# Altium footprint library GRID.PcbLib: 54 footprints (part 2 of 4)
Each footprint in its own frame and in the unit in brackets; x right, y up, seen from the top. Pads: shape width x height; smd on the part's side, far side on the other; paste and mask are expansions set on the pad; w line width, h text height; cw(c..) or ccw(c..) is an arc to the next point about the centre after c.
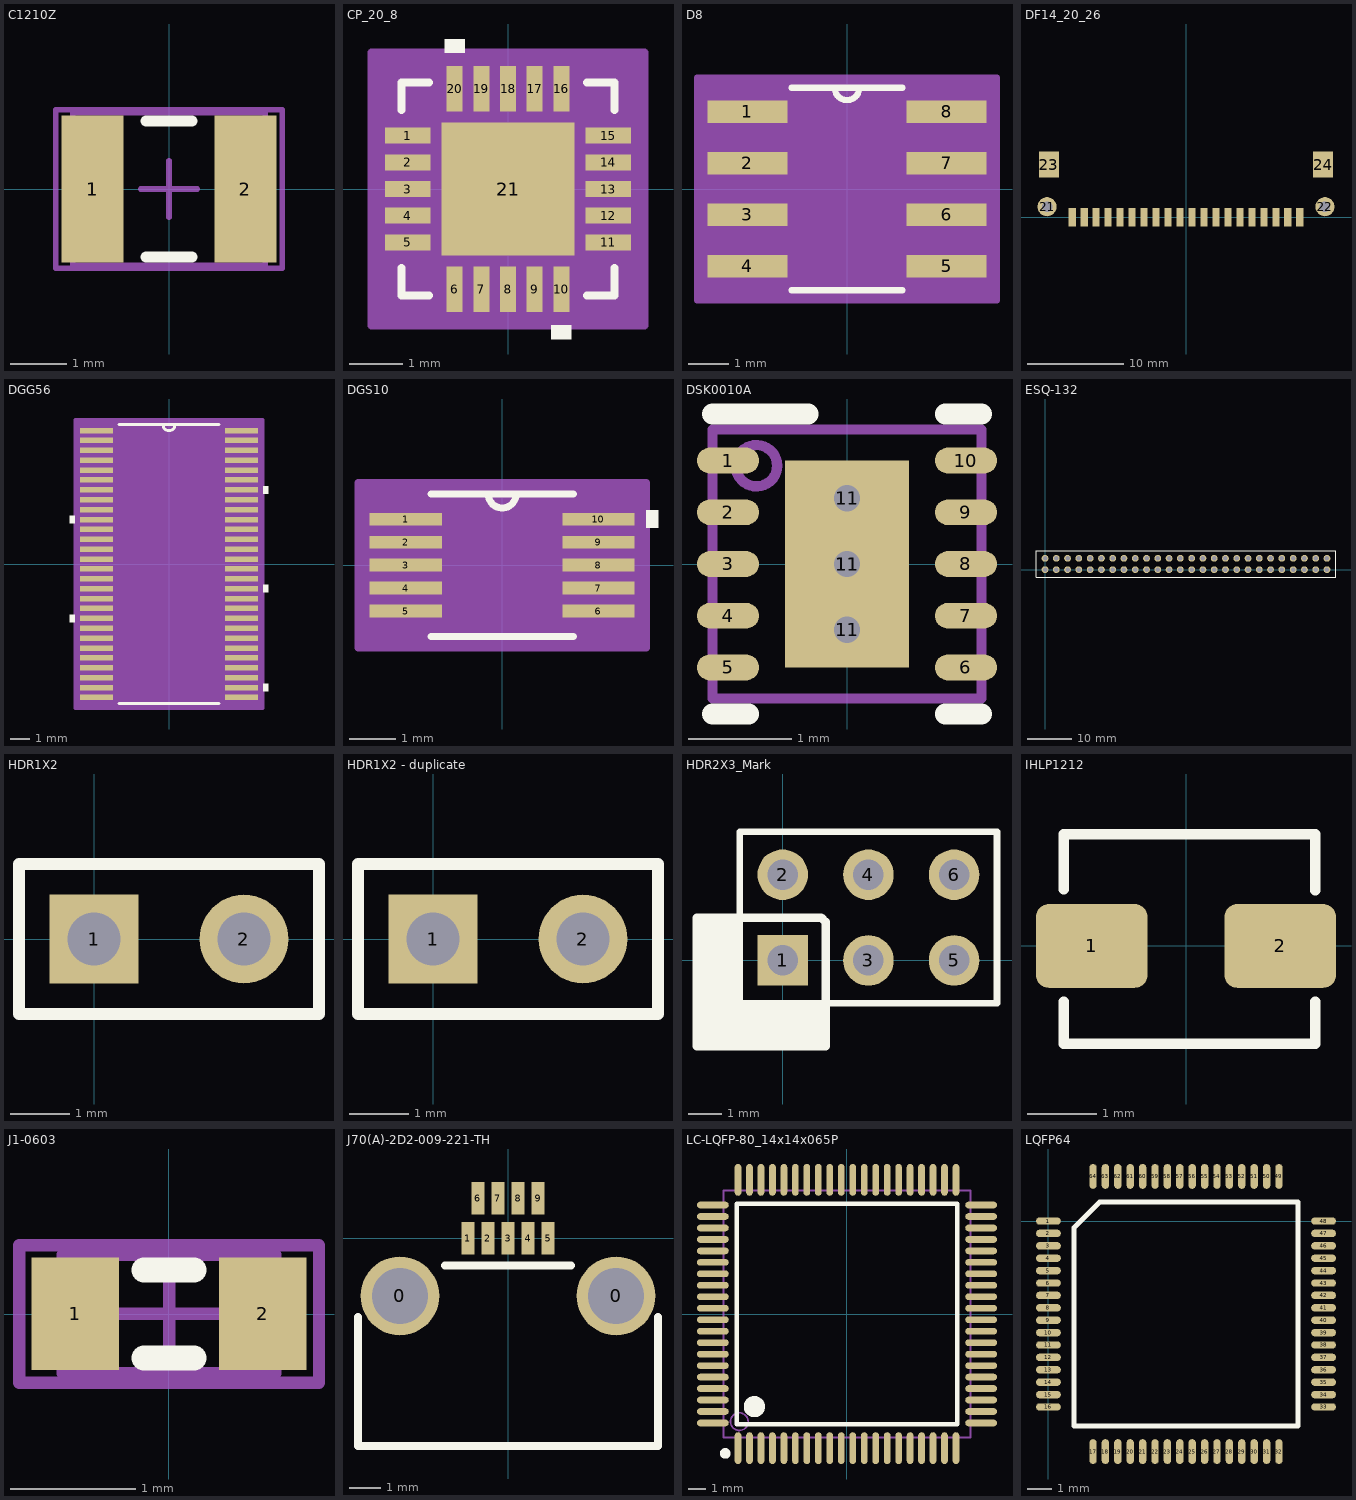
[diagram p1: the footprints below, top view; thin cyan lines are the x and y axes]

## C1210Z [mm] "Chip Capacitor, Body 3.2x2.5mm, IPC High Density"
height 1.3
pads (2):
  rect 1.1x2.6 smd: 1(-1.35,0) 2(1.35,0)
Top Overlay:
  lines w0.2: -0.4,-1.2 0.4,-1.2 ; -0.4,1.2 0.4,1.2
Mechanical 13:
  lines w0.1: -1.7,-1.35 -1.7,1.35 1.7,1.35 1.7,-1.35 -1.7,-1.35
Mechanical 15:
  lines w0.1: -0.5,0 0.5,0 ; 0,-0.5 0,0.5 ; -2,-1.4 -2,1.4 2,1.4 2,-1.4 -2,-1.4
3D body: height 1.3, standoff 0, extent -1.7,-1.35 1.7,1.35

## CP_20_8 [mm]
pads (21):
  rect 0.855x0.3 smd: 1(-1.877,1) 2(-1.877,0.5) 3(-1.877,0) 4(-1.877,-0.5) 5(-1.877,-1) 11(1.877,-1) 12(1.877,-0.5) 13(1.877,0) 14(1.877,0.5) 15(1.877,1)
  rect 0.3x0.855 smd: 6(-1,-1.877) 7(-0.5,-1.877) 8(0,-1.877) 9(0.5,-1.877) 10(1,-1.877) 16(1,1.877) 17(0.5,1.877) 18(0,1.877) 19(-0.5,1.877) 20(-1,1.877)
  rect 2.5x2.5 smd paste-1.287: 21(0,0)
Top Overlay:
  region: -0.81,2.559 -1.191,2.559 -1.191,2.813 -0.81,2.813
  region: 1.191,-2.559 0.81,-2.559 0.81,-2.813 1.191,-2.813
  lines w0.152: -2,-1.483 -2,-2 -1.483,-2 ; -2,1.483 -2,2 -1.483,2 ; 1.483,-2 2,-2 2,-1.483 ; 1.483,2 2,2 2,1.483
Mechanical 13:
  lines w0.025: -2,0.73 -0.73,2 ; -2,-2 -2,2 2,2 2,-2 -2,-2 ; -2,-1.15 -2,-0.85 -2,-1.15 ; -2,-0.65 -2,-0.35 -2,-0.65 ; -2,-0.15 -2,0.15 -2,-0.15 ; -2,0.35 -2,0.65 -2,0.35 ; -2,0.85 -2,1.15 -2,0.85 ; -1.15,-2 -0.85,-2 -1.15,-2 ; -1.15,2 -0.85,2 -1.15,2 ; -0.65,-2 -0.35,-2 -0.65,-2 ; -0.65,2 -0.35,2 -0.65,2 ; -0.15,-2 0.15,-2 -0.15,-2 ; -0.15,2 0.15,2 -0.15,2 ; 0.35,-2 0.65,-2 0.35,-2 ; 0.35,2 0.65,2 0.35,2 ; 0.85,-2 1.15,-2 0.85,-2 ; 0.85,2 1.15,2 0.85,2 ; 2,-1.15 2,-0.85 2,-1.15 ; 2,-0.65 2,-0.35 2,-0.65 ; 2,-0.15 2,0.15 2,-0.15 ; 2,0.35 2,0.65 2,0.35 ; 2,0.85 2,1.15 2,0.85
Mechanical 15:
  region: 2.559,-2.559 -2.559,-2.559 -2.559,2.559 2.559,2.559
  lines w0.152: -2.559,-2.559 2.559,-2.559 2.559,2.559 -2.559,2.559 -2.559,-2.559
3D body: height 0.25, standoff 0, extent 0,0 0.254,0.254

## D8 [mil]
pads (8):
  rect 78x22 smd: 1(-97,75) 2(-97,25) 3(-97,-25) 4(-97,-75) 5(97,-75) 6(97,-25) 7(97,25) 8(97,75)
Top Overlay:
  lines w6: -54.08,-98.5 54.08,-98.5 ; -54.08,98.5 54.08,98.5 ; -12,98.5 ccw(c0,98.5) 12,98.5
Mechanical 13:
  lines w0: -12,98.5 ccw(c0,98.5) 12,98.5
Mechanical 15:
  region: 146,-108.5 -146,-108.5 -146,108.5 146,108.5
  lines w6: -146,-108.5 146,-108.5 146,108.5 -146,108.5 -146,-108.5
3D body "D8.stp": height 69.1, standoff 0, extent -122,-98.5 122,98.5

## DF14_20_26 [mm]
pads (24):
  rect 0.75x1.9 smd: 1(-11.875,0) 2(-10.625,0) 3(-9.375,0) 4(-8.125,0) 5(-6.875,0) 6(-5.625,0) 7(-4.375,0) 8(-3.125,0) 9(-1.875,0) 10(-0.625,0) 11(0.625,0) 12(1.875,0) 13(3.125,0) 14(4.375,0) 15(5.625,0) 16(6.875,0) 17(8.125,0) 18(9.375,0) 19(10.625,0) 20(11.875,0)
  round 2 hole 1.1: 21(-14.5,1.1) 22(14.5,1.1)
  rect 2.1x2.7 smd: 23(-14.3,5.5) 24(14.3,5.5)
3D body "DF14-20P-1.25H.stp": height 2.5, standoff -0.6, extent -14.975,-0.477 14.975,6.223

## DGG56 [mil]
pads (56):
  rect 66x11 smd: 1(-144.5,265.75) 2(-144.5,246.06) 3(-144.5,226.38) 4(-144.5,206.69) 5(-144.5,187.01) 6(-144.5,167.32) 7(-144.5,147.64) 8(-144.5,127.95) 9(-144.5,108.27) 10(-144.5,88.58) 11(-144.5,68.9) 12(-144.5,49.21) 13(-144.5,29.53) 14(-144.5,9.84) 15(-144.5,-9.84) 16(-144.5,-29.53) 17(-144.5,-49.21) 18(-144.5,-68.9) 19(-144.5,-88.58) 20(-144.5,-108.27) 21(-144.5,-127.95) 22(-144.5,-147.64) 23(-144.5,-167.32) 24(-144.5,-187.01) 25(-144.5,-206.69) 26(-144.5,-226.38) 27(-144.5,-246.06) 28(-144.5,-265.75) 29(144.5,-265.75) 30(144.5,-246.06) 31(144.5,-226.38) 32(144.5,-206.69) 33(144.5,-187.01) 34(144.5,-167.32) 35(144.5,-147.64) 36(144.5,-127.95) 37(144.5,-108.27) 38(144.5,-88.58) 39(144.5,-68.9) 40(144.5,-49.21) 41(144.5,-29.53) 42(144.5,-9.84) 43(144.5,9.84) 44(144.5,29.53) 45(144.5,49.21) 46(144.5,68.9) 47(144.5,88.58) 48(144.5,108.27) 49(144.5,127.95) 50(144.5,147.64) 51(144.5,167.32) 52(144.5,187.01) 53(144.5,206.69) 54(144.5,226.38) 55(144.5,246.06) 56(144.5,265.75)
Top Overlay:
  region: -187.5,96.08 -197.5,96.08 -197.5,81.08 -187.5,81.08
  region: -187.5,-100.77 -197.5,-100.77 -197.5,-115.77 -187.5,-115.77
  region: 187.5,-238.56 197.5,-238.56 197.5,-253.56 187.5,-253.56
  region: 187.5,-41.71 197.5,-41.71 197.5,-56.71 187.5,-56.71
  region: 187.5,155.14 197.5,155.14 197.5,140.14 187.5,140.14
  lines w6: -99.99,-277.5 99.99,-277.5 ; -99.99,277.5 99.99,277.5 ; -12,277.5 ccw(c0,277.5) 12,277.5
Mechanical 13:
  lines w0: -12,277.5 ccw(c0,277.5) 12,277.5
Mechanical 15:
  region: 187.5,-287.5 -187.5,-287.5 -187.5,287.5 187.5,287.5
  lines w6: -187.5,-287.5 -187.5,287.5 187.5,287.5 187.5,-287.5 -187.5,-287.5
3D body "DGG56.stp": height 47.1, standoff 0, extent -163.5,-277.5 163.5,277.5

## DGS10 [mil]
pads (10):
  rect 62x11 smd: 1(-82.5,39.37) 2(-82.5,19.68) 3(-82.5,0) 4(-82.5,-19.68) 5(-82.5,-39.37) 6(82.5,-39.37) 7(82.5,-19.68) 8(82.5,0) 9(82.5,19.68) 10(82.5,39.37)
Top Overlay:
  region: 123.5,46.87 133.5,46.87 133.5,31.87 123.5,31.87
  lines w6: -61,-61 61,-61 ; -61,61 61,61 ; -12,61 ccw(c0,61) 12,61
Mechanical 13:
  lines w0: -12,61 ccw(c0,61) 12,61
Mechanical 15:
  region: 123.5,-71 -123.5,-71 -123.5,71 123.5,71
  lines w6: -123.5,-71 123.5,-71 123.5,71 -123.5,71 -123.5,-71
3D body "DGS10.stp": height 43.1, standoff 0, extent -99.5,-61 99.5,61

## DSK0010A [mm]
pads (14):
  oval 0.6x0.25 smd paste+0 mask+0: 1(-1.15,1) 2(-1.15,0.5) 3(-1.15,0) 4(-1.15,-0.5) 5(-1.15,-1) 6(1.15,-1) 7(1.15,-0.5) 8(1.15,0) 9(1.15,0.5) 10(1.15,1)
  round 0.457 hole 0.254: 11(0,-0.635) 11(0,0) 11(0,0.635)
  rect 1.2x2 smd paste-0.6 mask+0: 11(0,0)
Top Overlay:
  lines w0.2: -1.3,-1.45 -0.95,-1.45 ; -1.3,1.45 -0.375,1.45 ; 0.95,-1.45 1.3,-1.45 ; 0.95,1.45 1.3,1.45
Top Paste:
  region: -0.563,0.895 -0.563,-0.894 0.563,-0.894 0.563,0.895
Top Solder:
  region: 0.663,0.594 -0.663,0.594 -0.663,1.064 0.663,1.064
  region: 0.663,-0.194 -0.663,-0.194 -0.663,0.194 0.663,0.194
  region: 0.663,-1.064 -0.663,-1.064 -0.663,-0.594 0.663,-0.594
  region: -0.2,-1.064 -0.663,-1.064 -0.663,1.064 -0.2,1.064
  region: 0.663,-1.064 0.2,-1.064 0.2,1.064 0.663,1.064
  region: 0,1
  region: 0,-1
Mechanical 13:
  circle w0.1: c-0.875,0.95 r0.2
  lines w0.1: -1.3,-1.3 1.3,-1.3 1.3,1.3 -1.3,1.3 -1.3,-1.3

## ESQ-132 [mil]
pads (52):
  round 60 hole 40 mask+3: 1(0,0) 2(0,100) 3(100,0) 4(100,100) 5(200,0) 6(200,100) 7(300,0) 8(300,100) 9(400,0) 10(400,100) 11(500,0) 12(500,100) 13(600,0) 14(600,100) 15(700,0) 16(700,100) 17(800,0) 18(800,100) 19(900,0) 20(900,100) 21(1000,0) 22(1000,100) 23(1100,0) 24(1100,100) 25(1200,0) 26(1200,100) 27(1300,0) 28(1300,100) 29(1400,0) 30(1400,100) 31(1500,0) 32(1500,100) 33(1600,0) 34(1600,100) 35(1700,0) 36(1700,100) 37(1800,0) 38(1800,100) 39(1900,0) 40(1900,100) 41(2000,0) 42(2000,100) 43(2100,0) 44(2100,100) 45(2200,0) 46(2200,100) 47(2300,0) 48(2300,100) 49(2400,0) 50(2400,100) 51(2500,0) 52(2500,100)
Top Overlay:
  lines w10: -80,-67.5 2580,-67.5 2580,167.5 -80,167.5 -80,-67.5

## HDR1X2 [mm] "Connector; Header; 2 Position"
height 0.305
pads (2):
  rect 1.5x1.5 hole 0.9: 1(0,0)
  round 1.5 hole 0.9: 2(2.54,0)
Top Overlay:
  lines w0.2: -1.27,-1.27 3.81,-1.27 3.81,1.27 -1.27,1.27 -1.27,-1.27

## HDR1X2 - duplicate [mm] "Connector; Header; 2 Position"
height 0.305
pads (2):
  rect 1.5x1.5 hole 0.9: 1(0,0)
  round 1.5 hole 0.9: 2(2.54,0)
Top Overlay:
  lines w0.2: -1.27,-1.27 3.81,-1.27 3.81,1.27 -1.27,1.27 -1.27,-1.27

## HDR2X3_Mark [mm]
pads (6):
  rect 1.5x1.5 hole 0.9: 1(0,0)
  round 1.5 hole 0.9: 2(0,2.54) 3(2.54,0) 4(2.54,2.54) 5(5.08,0) 6(5.08,2.54)
Top Overlay:
  rectangle: -2.54,-2.54 -1.27,1.27
  rectangle: -2.54,-2.54 1.27,-1.27
  lines w0.2: 1.482,-1.27 6.35,-1.27 ; 6.35,-1.27 6.35,3.81 -1.27,3.81 -1.27,-1.27 6.35,-1.27
  lines w0.254: -2.54,-2.54 -2.54,1.27 1.143,1.27 1.27,1.143 1.27,-2.54 -2.54,-2.54
3D body "TSW-103-08-X-D.STEP": height 6.98, standoff -6.48, extent -1.27,-1.27 6.35,3.81

## IHLP1212 [mm]
pads (2):
  rrect30% 1.6x1.2 smd: 1(-1.35,0) 2(1.35,0)
Top Overlay:
  lines w0.152: -1.75,-0.8 -1.75,-1.4 1.85,-1.4 1.85,-0.8 ; -1.75,0.811 -1.75,1.6 1.85,1.6 1.85,0.8
3D body "User Library-IHLP1212.STEP": height 2.01, standoff -0.03, extent -1.779,-1.397 1.879,1.6

## J1-0603 [mm] "Chip Resistor, Body 1.6x0.8mm, IPC High Density"
height 0.9
pads (2):
  rect 0.7x0.9 smd: 1(-0.75,0) 2(0.75,0)
Top Overlay:
  lines w0.2: -0.2,-0.35 0.2,-0.35 ; -0.2,0.35 0.2,0.35
Mechanical 13:
  lines w0.1: -0.85,-0.475 0.85,-0.475 0.85,0.475 -0.85,0.475 -0.85,-0.475
Mechanical 15:
  lines w0.1: -0.475,0 0.475,0 ; 0,-0.475 0,0.475 ; -1.2,-0.55 1.2,-0.55 1.2,0.55 -1.2,0.55 -1.2,-0.55
3D body: height 0.9, standoff 0, extent -0.85,-0.475 0.85,0.475

## J70(A)-2D2-009-221-TH [mm]
pads (11):
  round 2.5 hole 1.78: 0(-3.43,-1.83) 0(3.43,-1.83)
  rect 0.4x1.02 smd: 1(-1.27,0) 2(-0.635,0) 3(0,0) 4(0.635,0) 5(1.27,0) 6(-0.953,1.27) 7(-0.318,1.27) 8(0.318,1.27) 9(0.953,1.27)
Top Overlay:
  lines w0.254: -4.76,-2.5 -4.76,-6.59 4.76,-6.59 4.76,-2.5 ; -2,-0.87 2,-0.87

## LC-LQFP-80_14x14x065P [mm]
pads (80):
  oval 0.38x1.8 smd mask+0.051: 1(-6.175,-7.6) 2(-5.525,-7.6) 3(-4.875,-7.6) 4(-4.225,-7.6) 5(-3.575,-7.6) 6(-2.925,-7.6) 7(-2.275,-7.6) 8(-1.625,-7.6) 9(-0.975,-7.6) 10(-0.325,-7.6) 11(0.325,-7.6) 12(0.975,-7.6) 13(1.625,-7.6) 14(2.275,-7.6) 15(2.925,-7.6) 16(3.575,-7.6) 17(4.225,-7.6) 18(4.875,-7.6) 19(5.525,-7.6) 20(6.175,-7.6) 41(6.175,7.6) 42(5.525,7.6) 43(4.875,7.6) 44(4.225,7.6) 45(3.575,7.6) 46(2.925,7.6) 47(2.275,7.6) 48(1.625,7.6) 49(0.975,7.6) 50(0.325,7.6) 51(-0.325,7.6) 52(-0.975,7.6) 53(-1.625,7.6) 54(-2.275,7.6) 55(-2.925,7.6) 56(-3.575,7.6) 57(-4.225,7.6) 58(-4.875,7.6) 59(-5.525,7.6) 60(-6.175,7.6)
  oval 1.8x0.38 smd mask+0.051: 21(7.6,-6.175) 22(7.6,-5.525) 23(7.6,-4.875) 24(7.6,-4.225) 25(7.6,-3.575) 26(7.6,-2.925) 27(7.6,-2.275) 28(7.6,-1.625) 29(7.6,-0.975) 30(7.6,-0.325) 31(7.6,0.325) 32(7.6,0.975) 33(7.6,1.625) 34(7.6,2.275) 35(7.6,2.925) 36(7.6,3.575) 37(7.6,4.225) 38(7.6,4.875) 39(7.6,5.525) 40(7.6,6.175) 61(-7.6,6.175) 62(-7.6,5.525) 63(-7.6,4.875) 64(-7.6,4.225) 65(-7.6,3.575) 66(-7.6,2.925) 67(-7.6,2.275) 68(-7.6,1.625) 69(-7.6,0.975) 70(-7.6,0.325) 71(-7.6,-0.325) 72(-7.6,-0.975) 73(-7.6,-1.625) 74(-7.6,-2.275) 75(-7.6,-2.925) 76(-7.6,-3.575) 77(-7.6,-4.225) 78(-7.6,-4.875) 79(-7.6,-5.525) 80(-7.6,-6.175)
Top Overlay:
  circle w0.3: c-6.9,-7.9 r0.15
  circle w0.6: c-5.25,-5.25 r0.3
  lines w0.254: -6.25,-6.25 6.25,-6.25 6.25,6.25 -6.25,6.25 -6.25,-6.25
Mechanical 13:
  circle w0.1: c-6.1,-6.1 r0.5
  lines w0.1: -7,-7 7,-7 7,7 -7,7 -7,-7

## LQFP64 [mm]
height 1.4
pads (64):
  oval 1x0.3 smd: 1(0,0) 2(0,-0.5) 3(0,-1) 4(0,-1.5) 5(0,-2) 6(0,-2.5) 7(0,-3) 8(0,-3.5) 9(0,-4) 10(0,-4.5) 11(0,-5) 12(0,-5.5) 13(0,-6) 14(0,-6.5) 15(0,-7) 16(0,-7.5) 33(11.1,-7.5) 34(11.1,-7) 35(11.1,-6.5) 36(11.1,-6) 37(11.1,-5.5) 38(11.1,-5) 39(11.1,-4.5) 40(11.1,-4) 41(11.1,-3.5) 42(11.1,-3) 43(11.1,-2.5) 44(11.1,-2) 45(11.1,-1.5) 46(11.1,-1) 47(11.1,-0.5) 48(11.1,0)
  oval 0.3x1 smd: 17(1.8,-9.3) 18(2.3,-9.3) 19(2.8,-9.3) 20(3.3,-9.3) 21(3.8,-9.3) 22(4.3,-9.3) 23(4.8,-9.3) 24(5.3,-9.3) 25(5.8,-9.3) 26(6.3,-9.3) 27(6.8,-9.3) 28(7.3,-9.3) 29(7.8,-9.3) 30(8.3,-9.3) 31(8.8,-9.3) 32(9.3,-9.3) 49(9.3,1.8) 50(8.8,1.8) 51(8.3,1.8) 52(7.8,1.8) 53(7.3,1.8) 54(6.8,1.8) 55(6.3,1.8) 56(5.8,1.8) 57(5.3,1.8) 58(4.8,1.8) 59(4.3,1.8) 60(3.8,1.8) 61(3.3,1.8) 62(2.8,1.8) 63(2.3,1.8) 64(1.8,1.8)
Top Overlay:
  lines w0.2: 1.035,-8.265 1.035,-0.27 2.07,0.765 10.065,0.765 10.065,-8.265 1.035,-8.265